# Altium schematic symbol library MCU_Microchip_ATmega.SchLib: 440 symbols (part 6 of 7)
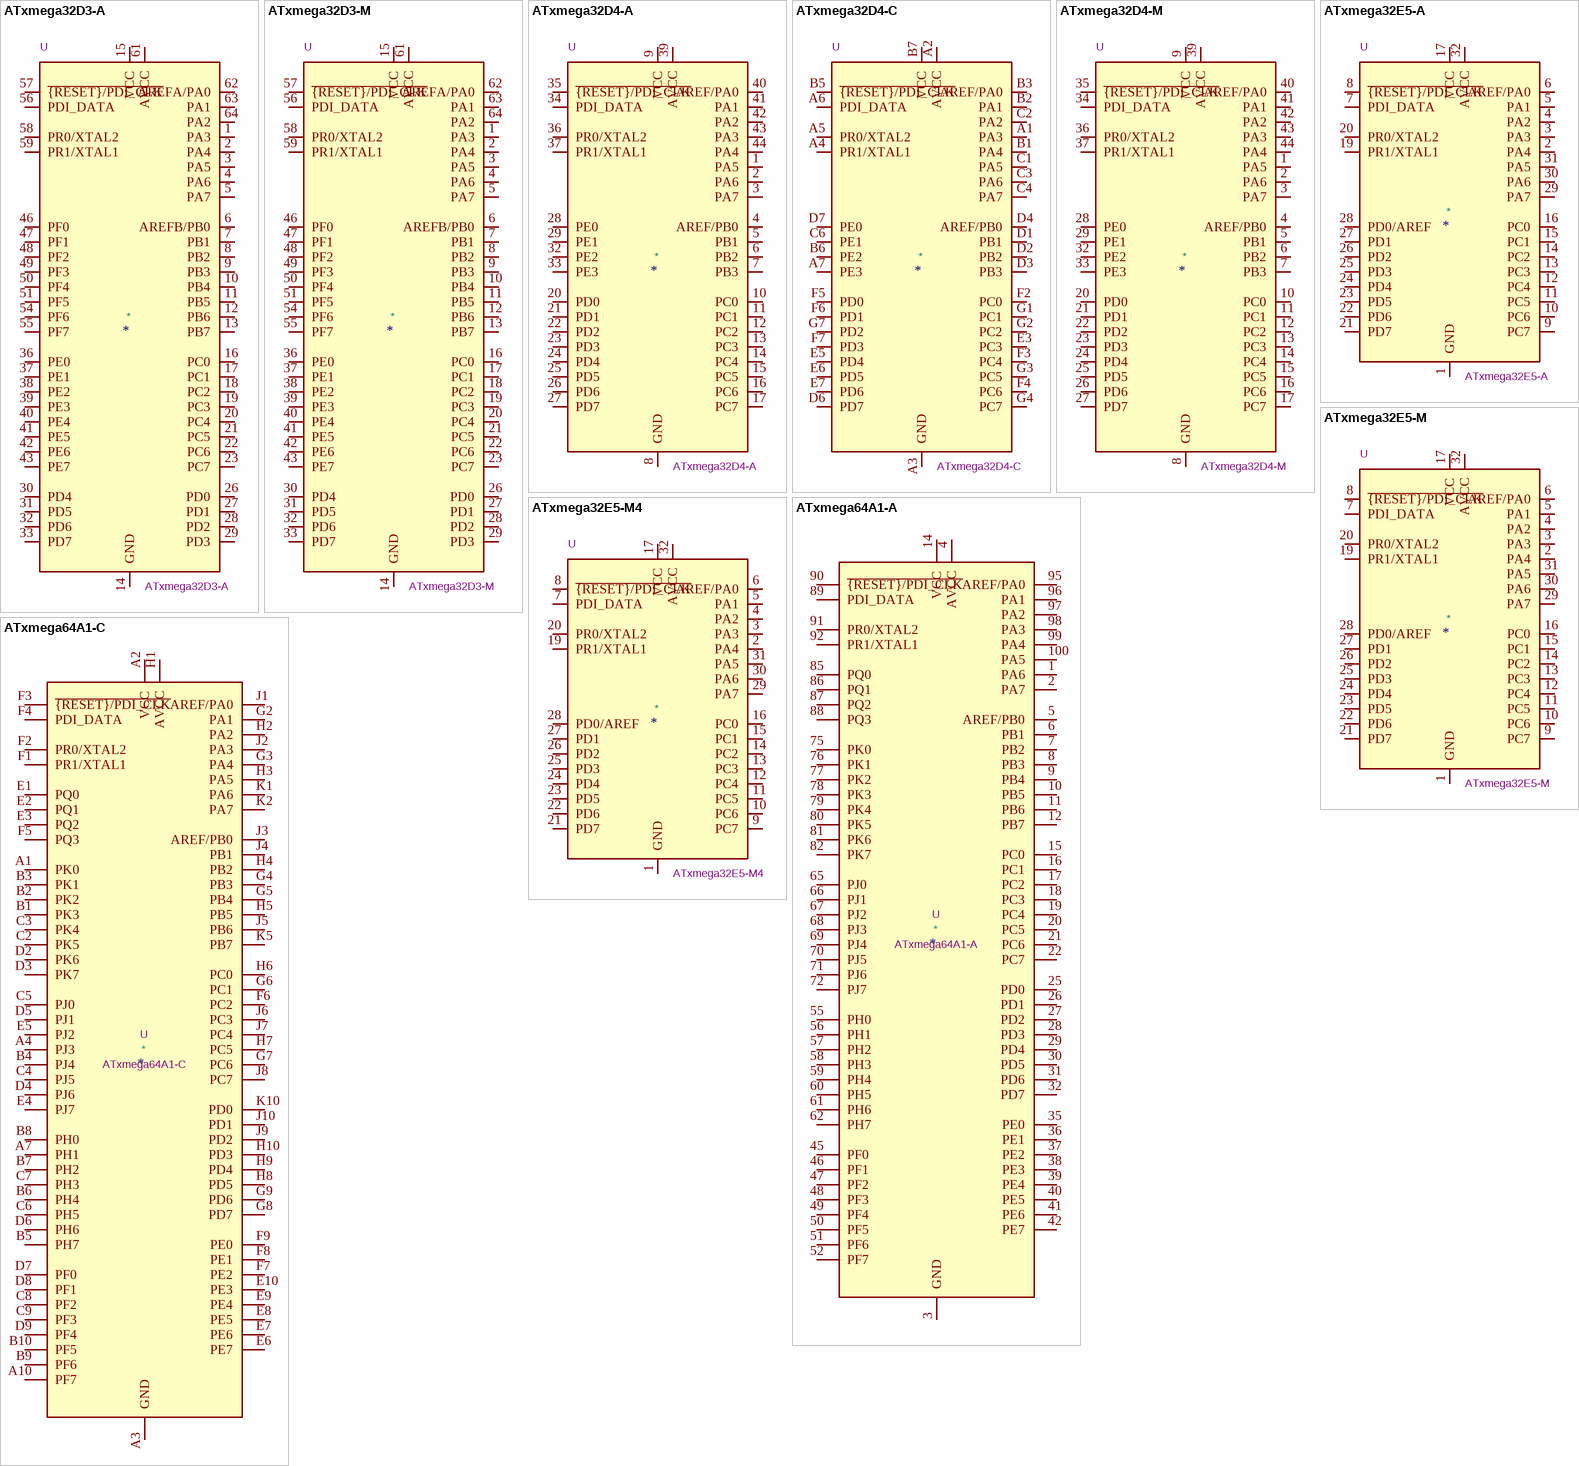
[diagram p45: symbols ATxmega32D3-A to ATxmega64A1-C]

## ATxmega64A1-A
designator *  value ATxmega64A1-A  Reference: U
ki_keywords: AVR 8/16bit Microcontroller XMegaAVR; ki_description: 32MHz, 64kB Flash, 4kB Boot, 4kB SRAM, 2kB EEPROM, JTAG, TQFP-100; ki_fp_filters: TQFP*14x14mm*P0.5mm*; Footprint: Package_QFP:TQFP-100_14x14mm_P0.5mm; Datasheet: http://ww1.microchip.com/downloads/en/DeviceDoc/Atmel-8067-8-and-16-bit-AVR-Microcontrollers-ATxmega64A1-ATxmega128A1_Datasheet.pdf
pins: 1 PA6, 2 PA7, 3 GND, 4 AVCC, 5 AREF/PB0, 6 PB1, 7 PB2, 8 PB3, 9 PB4, 10 PB5, 11 PB6, 12 PB7, 13 GND hidden, 14 VCC, 15 PC0, 16 PC1, 17 PC2, 18 PC3, 19 PC4, 20 PC5, 21 PC6, 22 PC7, 23 GND hidden, 24 VCC hidden, 25 PD0, 26 PD1, 27 PD2, 28 PD3, 29 PD4, 30 PD5, 31 PD6, 32 PD7, 33 GND hidden, 34 VCC hidden, 35 PE0, 36 PE1, 37 PE2, 38 PE3, 39 PE4, 40 PE5, 41 PE6, 42 PE7, 43 GND hidden, 44 VCC hidden, 45 PF0, 46 PF1, 47 PF2, 48 PF3, 49 PF4, 50 PF5, 51 PF6, 52 PF7, 53 GND hidden, 54 VCC hidden, 55 PH0, 56 PH1, 57 PH2, 58 PH3, 59 PH4, 60 PH5, 61 PH6, 62 PH7, 63 GND hidden, 64 VCC hidden, 65 PJ0, 66 PJ1, 67 PJ2, 68 PJ3, 69 PJ4, 70 PJ5, 71 PJ6, 72 PJ7, 73 GND hidden, 74 VCC hidden, 75 PK0, 76 PK1, 77 PK2, 78 PK3, 79 PK4, 80 PK5, 81 PK6, 82 PK7, 83 VCC hidden, 84 GND hidden, 85 PQ0, 86 PQ1, 87 PQ2, 88 PQ3, 89 PDI_DATA, 90 ~{{RESET}/PDI_CLK}, 91 PR0/XTAL2, 92 PR1/XTAL1, 93 GND hidden, 94 AVCC hidden, 95 AREF/PA0, 96 PA1, 97 PA2, 98 PA3, 99 PA4, 100 PA5

## ATxmega64A1-C
designator *  value ATxmega64A1-C  Reference: U
ki_keywords: AVR 8/16bit Microcontroller XMegaAVR; ki_description: 32MHz, 64kB Flash, 4kB Boot, 4kB SRAM, 2kB EEPROM, JTAG, TFBGA-100; ki_fp_filters: TFBGA*9.0x9.0mm*Layout10x10*P0.8mm*; Footprint: Package_BGA:TFBGA-100_9.0x9.0mm_Layout10x10_P0.8mm; Datasheet: http://ww1.microchip.com/downloads/en/DeviceDoc/Atmel-8067-8-and-16-bit-AVR-Microcontrollers-ATxmega64A1-ATxmega128A1_Datasheet.pdf
pins: A1 PK0, A2 VCC, A3 GND, A4 PJ3, A5 VCC hidden, A6 GND hidden, A7 PH1, A8 GND hidden, A9 VCC hidden, A10 PF7, B1 PK3, B2 PK2, B3 PK1, B4 PJ4, B5 PH7, B6 PH4, B7 PH2, B8 PH0, B9 PF6, B10 PF5, C1 VCC hidden, C2 PK5, C3 PK4, C4 PJ5, C5 PJ0, C6 PH5, C7 PH3, C8 PF2, C9 PF3, C10 VCC hidden, D1 GND hidden, D2 PK6, D3 PK7, D4 PJ6, D5 PJ1, D6 PH6, D7 PF0, D8 PF1, D9 PF4, D10 GND hidden, E1 PQ0, E2 PQ1, E3 PQ2, E4 PJ7, E5 PJ2, E6 PE7, E7 PE6, E8 PE5, E9 PE4, E10 PE3, F1 PR1/XTAL1, F2 PR0/XTAL2, F3 ~{{RESET}/PDI_CLK}, F4 PDI_DATA, F5 PQ3, F6 PC2, F7 PE2, F8 PE1, F9 PE0, F10 VCC hidden, G1 GND hidden, G2 PA1, G3 PA4, G4 PB3, G5 PB4, G6 PC1, G7 PC6, G8 PD7, G9 PD6, G10 GND hidden, H1 AVCC, H2 PA2, H3 PA5, H4 PB2, H5 PB5, H6 PC0, H7 PC5, H8 PD5, H9 PD4, H10 PD3, J1 AREF/PA0, J2 PA3, J3 AREF/PB0, J4 PB1, J5 PB6, J6 PC3, J7 PC4, J8 PC7, J9 PD2, J10 PD1, K1 PA6, K2 PA7, K3 GND hidden, K4 AVCC hidden, K5 PB7, K6 VCC hidden, K7 GND hidden, K8 VCC hidden, K9 GND hidden, K10 PD0

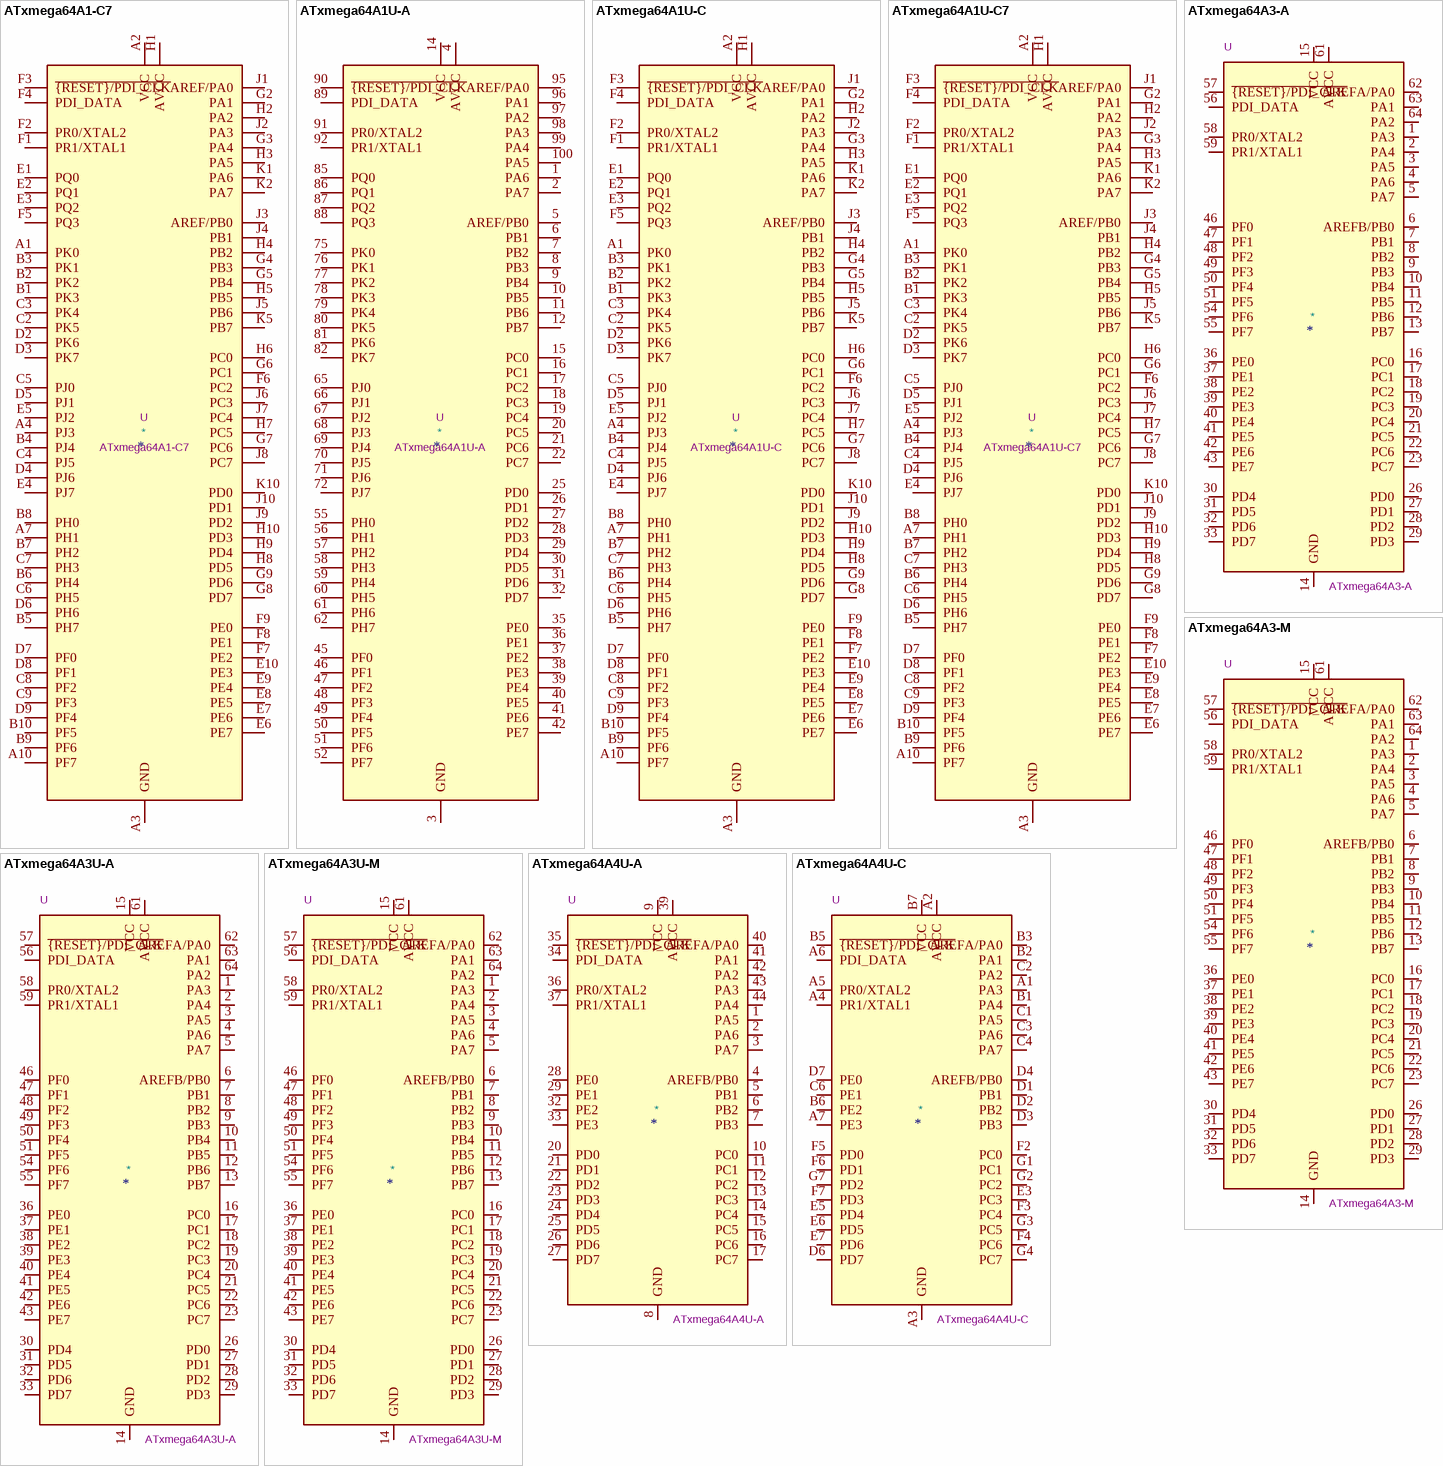
[diagram p33: symbols ATxmega64A1-C7 to ATxmega64A4U-C]

## ATxmega64A1-C7
designator *  value ATxmega64A1-C7  Reference: U
ki_keywords: AVR 8/16bit Microcontroller XMegaAVR; ki_description: 32MHz, 64kB Flash, 4kB Boot, 4kB SRAM, 2kB EEPROM, JTAG, VFBGA-100; ki_fp_filters: VFBGA*7.0x7.0mm*Layout10x10*P0.65mm*; Footprint: Package_BGA:VFBGA-100_7.0x7.0mm_Layout10x10_P0.65mm; Datasheet: http://ww1.microchip.com/downloads/en/DeviceDoc/Atmel-8067-8-and-16-bit-AVR-Microcontrollers-ATxmega64A1-ATxmega128A1_Datasheet.pdf
pins: A1 PK0, A2 VCC, A3 GND, A4 PJ3, A5 VCC hidden, A6 GND hidden, A7 PH1, A8 GND hidden, A9 VCC hidden, A10 PF7, B1 PK3, B2 PK2, B3 PK1, B4 PJ4, B5 PH7, B6 PH4, B7 PH2, B8 PH0, B9 PF6, B10 PF5, C1 VCC hidden, C2 PK5, C3 PK4, C4 PJ5, C5 PJ0, C6 PH5, C7 PH3, C8 PF2, C9 PF3, C10 VCC hidden, D1 GND hidden, D2 PK6, D3 PK7, D4 PJ6, D5 PJ1, D6 PH6, D7 PF0, D8 PF1, D9 PF4, D10 GND hidden, E1 PQ0, E2 PQ1, E3 PQ2, E4 PJ7, E5 PJ2, E6 PE7, E7 PE6, E8 PE5, E9 PE4, E10 PE3, F1 PR1/XTAL1, F2 PR0/XTAL2, F3 ~{{RESET}/PDI_CLK}, F4 PDI_DATA, F5 PQ3, F6 PC2, F7 PE2, F8 PE1, F9 PE0, F10 VCC hidden, G1 GND hidden, G2 PA1, G3 PA4, G4 PB3, G5 PB4, G6 PC1, G7 PC6, G8 PD7, G9 PD6, G10 GND hidden, H1 AVCC, H2 PA2, H3 PA5, H4 PB2, H5 PB5, H6 PC0, H7 PC5, H8 PD5, H9 PD4, H10 PD3, J1 AREF/PA0, J2 PA3, J3 AREF/PB0, J4 PB1, J5 PB6, J6 PC3, J7 PC4, J8 PC7, J9 PD2, J10 PD1, K1 PA6, K2 PA7, K3 GND hidden, K4 AVCC hidden, K5 PB7, K6 VCC hidden, K7 GND hidden, K8 VCC hidden, K9 GND hidden, K10 PD0

## ATxmega64A1U-A
designator *  value ATxmega64A1U-A  Reference: U
ki_keywords: AVR 8/16bit Microcontroller XMegaAVR; ki_description: 32MHz, 64kB Flash, 4kB Boot, 4kB SRAM, 2kB EEPROM, JTAG, USB, TQFP-100; ki_fp_filters: TQFP*14x14mm*P0.5mm*; Footprint: Package_QFP:TQFP-100_14x14mm_P0.5mm; Datasheet: http://ww1.microchip.com/downloads/en/DeviceDoc/Atmel-8385-8-and-16-bit-AVR-Microcontroller-ATxmega64A1U-ATxmega128A1U_datasheet.pdf
pins: 1 PA6, 2 PA7, 3 GND, 4 AVCC, 5 AREF/PB0, 6 PB1, 7 PB2, 8 PB3, 9 PB4, 10 PB5, 11 PB6, 12 PB7, 13 GND hidden, 14 VCC, 15 PC0, 16 PC1, 17 PC2, 18 PC3, 19 PC4, 20 PC5, 21 PC6, 22 PC7, 23 GND hidden, 24 VCC hidden, 25 PD0, 26 PD1, 27 PD2, 28 PD3, 29 PD4, 30 PD5, 31 PD6, 32 PD7, 33 GND hidden, 34 VCC hidden, 35 PE0, 36 PE1, 37 PE2, 38 PE3, 39 PE4, 40 PE5, 41 PE6, 42 PE7, 43 GND hidden, 44 VCC hidden, 45 PF0, 46 PF1, 47 PF2, 48 PF3, 49 PF4, 50 PF5, 51 PF6, 52 PF7, 53 GND hidden, 54 VCC hidden, 55 PH0, 56 PH1, 57 PH2, 58 PH3, 59 PH4, 60 PH5, 61 PH6, 62 PH7, 63 GND hidden, 64 VCC hidden, 65 PJ0, 66 PJ1, 67 PJ2, 68 PJ3, 69 PJ4, 70 PJ5, 71 PJ6, 72 PJ7, 73 GND hidden, 74 VCC hidden, 75 PK0, 76 PK1, 77 PK2, 78 PK3, 79 PK4, 80 PK5, 81 PK6, 82 PK7, 83 VCC hidden, 84 GND hidden, 85 PQ0, 86 PQ1, 87 PQ2, 88 PQ3, 89 PDI_DATA, 90 ~{{RESET}/PDI_CLK}, 91 PR0/XTAL2, 92 PR1/XTAL1, 93 GND hidden, 94 AVCC hidden, 95 AREF/PA0, 96 PA1, 97 PA2, 98 PA3, 99 PA4, 100 PA5

## ATxmega64A1U-C
designator *  value ATxmega64A1U-C  Reference: U
ki_keywords: AVR 8/16bit Microcontroller XMegaAVR; ki_description: 32MHz, 64kB Flash, 4kB Boot, 4kB SRAM, 2kB EEPROM, JTAG, USB, TFBGA-100; ki_fp_filters: TFBGA*9.0x9.0mm*Layout10x10*P0.8mm*; Footprint: Package_BGA:TFBGA-100_9.0x9.0mm_Layout10x10_P0.8mm; Datasheet: http://ww1.microchip.com/downloads/en/DeviceDoc/Atmel-8385-8-and-16-bit-AVR-Microcontroller-ATxmega64A1U-ATxmega128A1U_datasheet.pdf
pins: A1 PK0, A2 VCC, A3 GND, A4 PJ3, A5 VCC hidden, A6 GND hidden, A7 PH1, A8 GND hidden, A9 VCC hidden, A10 PF7, B1 PK3, B2 PK2, B3 PK1, B4 PJ4, B5 PH7, B6 PH4, B7 PH2, B8 PH0, B9 PF6, B10 PF5, C1 VCC hidden, C2 PK5, C3 PK4, C4 PJ5, C5 PJ0, C6 PH5, C7 PH3, C8 PF2, C9 PF3, C10 VCC hidden, D1 GND hidden, D2 PK6, D3 PK7, D4 PJ6, D5 PJ1, D6 PH6, D7 PF0, D8 PF1, D9 PF4, D10 GND hidden, E1 PQ0, E2 PQ1, E3 PQ2, E4 PJ7, E5 PJ2, E6 PE7, E7 PE6, E8 PE5, E9 PE4, E10 PE3, F1 PR1/XTAL1, F2 PR0/XTAL2, F3 ~{{RESET}/PDI_CLK}, F4 PDI_DATA, F5 PQ3, F6 PC2, F7 PE2, F8 PE1, F9 PE0, F10 VCC hidden, G1 GND hidden, G2 PA1, G3 PA4, G4 PB3, G5 PB4, G6 PC1, G7 PC6, G8 PD7, G9 PD6, G10 GND hidden, H1 AVCC, H2 PA2, H3 PA5, H4 PB2, H5 PB5, H6 PC0, H7 PC5, H8 PD5, H9 PD4, H10 PD3, J1 AREF/PA0, J2 PA3, J3 AREF/PB0, J4 PB1, J5 PB6, J6 PC3, J7 PC4, J8 PC7, J9 PD2, J10 PD1, K1 PA6, K2 PA7, K3 GND hidden, K4 AVCC hidden, K5 PB7, K6 VCC hidden, K7 GND hidden, K8 VCC hidden, K9 GND hidden, K10 PD0

## ATxmega64A1U-C7
designator *  value ATxmega64A1U-C7  Reference: U
ki_keywords: AVR 8/16bit Microcontroller XMegaAVR; ki_description: 32MHz, 64kB Flash, 4kB Boot, 4kB SRAM, 2kB EEPROM, JTAG, USB, VFBGA-100; ki_fp_filters: VFBGA*7.0x7.0mm*Layout10x10*P0.65mm*; Footprint: Package_BGA:VFBGA-100_7.0x7.0mm_Layout10x10_P0.65mm; Datasheet: http://ww1.microchip.com/downloads/en/DeviceDoc/Atmel-8385-8-and-16-bit-AVR-Microcontroller-ATxmega64A1U-ATxmega128A1U_datasheet.pdf
pins: A1 PK0, A2 VCC, A3 GND, A4 PJ3, A5 VCC hidden, A6 GND hidden, A7 PH1, A8 GND hidden, A9 VCC hidden, A10 PF7, B1 PK3, B2 PK2, B3 PK1, B4 PJ4, B5 PH7, B6 PH4, B7 PH2, B8 PH0, B9 PF6, B10 PF5, C1 VCC hidden, C2 PK5, C3 PK4, C4 PJ5, C5 PJ0, C6 PH5, C7 PH3, C8 PF2, C9 PF3, C10 VCC hidden, D1 GND hidden, D2 PK6, D3 PK7, D4 PJ6, D5 PJ1, D6 PH6, D7 PF0, D8 PF1, D9 PF4, D10 GND hidden, E1 PQ0, E2 PQ1, E3 PQ2, E4 PJ7, E5 PJ2, E6 PE7, E7 PE6, E8 PE5, E9 PE4, E10 PE3, F1 PR1/XTAL1, F2 PR0/XTAL2, F3 ~{{RESET}/PDI_CLK}, F4 PDI_DATA, F5 PQ3, F6 PC2, F7 PE2, F8 PE1, F9 PE0, F10 VCC hidden, G1 GND hidden, G2 PA1, G3 PA4, G4 PB3, G5 PB4, G6 PC1, G7 PC6, G8 PD7, G9 PD6, G10 GND hidden, H1 AVCC, H2 PA2, H3 PA5, H4 PB2, H5 PB5, H6 PC0, H7 PC5, H8 PD5, H9 PD4, H10 PD3, J1 AREF/PA0, J2 PA3, J3 AREF/PB0, J4 PB1, J5 PB6, J6 PC3, J7 PC4, J8 PC7, J9 PD2, J10 PD1, K1 PA6, K2 PA7, K3 GND hidden, K4 AVCC hidden, K5 PB7, K6 VCC hidden, K7 GND hidden, K8 VCC hidden, K9 GND hidden, K10 PD0

## ATxmega64A3-A
designator *  value ATxmega64A3-A  Reference: U
ki_keywords: AVR 8/16bit Microcontroller XMegaAVR; ki_description: 32MHz, 64kB Flash, 4kB Boot, 4kB SRAM, 2kB EEPROM, JTAG, TQFP-64; ki_fp_filters: TQFP*14x14mm*P0.8mm*; Footprint: Package_QFP:TQFP-64_14x14mm_P0.8mm; Datasheet: http://ww1.microchip.com/downloads/en/DeviceDoc/Atmel-8068-8-and16-bit-AVR-XMEGA-A3-Microcontrollers_Datasheet.pdf
pins: 1 PA3, 2 PA4, 3 PA5, 4 PA6, 5 PA7, 6 AREFB/PB0, 7 PB1, 8 PB2, 9 PB3, 10 PB4, 11 PB5, 12 PB6, 13 PB7, 14 GND, 15 VCC, 16 PC0, 17 PC1, 18 PC2, 19 PC3, 20 PC4, 21 PC5, 22 PC6, 23 PC7, 24 GND hidden, 25 VCC hidden, 26 PD0, 27 PD1, 28 PD2, 29 PD3, 30 PD4, 31 PD5, 32 PD6, 33 PD7, 34 GND hidden, 35 VCC hidden, 36 PE0, 37 PE1, 38 PE2, 39 PE3, 40 PE4, 41 PE5, 42 PE6, 43 PE7, 44 GND hidden, 45 VCC hidden, 46 PF0, 47 PF1, 48 PF2, 49 PF3, 50 PF4, 51 PF5, 52 GND hidden, 53 VCC hidden, 54 PF6, 55 PF7, 56 PDI_DATA, 57 ~{{RESET}/PDI_CLK}, 58 PR0/XTAL2, 59 PR1/XTAL1, 60 GND hidden, 61 AVCC, 62 AREFA/PA0, 63 PA1, 64 PA2

## ATxmega64A3-M
designator *  value ATxmega64A3-M  Reference: U
ki_keywords: AVR 8/16bit Microcontroller XMegaAVR; ki_description: 32MHz, 64kB Flash, 4kB Boot, 4kB SRAM, 2kB EEPROM, JTAG, QFN-64; ki_fp_filters: QFN*1EP*9x9mm*P0.5mm*; Footprint: Package_DFN_QFN:QFN-64-1EP_9x9mm_P0.5mm_EP7.65x7.65mm; Datasheet: http://ww1.microchip.com/downloads/en/DeviceDoc/Atmel-8068-8-and16-bit-AVR-XMEGA-A3-Microcontrollers_Datasheet.pdf
pins: 1 PA3, 2 PA4, 3 PA5, 4 PA6, 5 PA7, 6 AREFB/PB0, 7 PB1, 8 PB2, 9 PB3, 10 PB4, 11 PB5, 12 PB6, 13 PB7, 14 GND, 15 VCC, 16 PC0, 17 PC1, 18 PC2, 19 PC3, 20 PC4, 21 PC5, 22 PC6, 23 PC7, 24 GND hidden, 25 VCC hidden, 26 PD0, 27 PD1, 28 PD2, 29 PD3, 30 PD4, 31 PD5, 32 PD6, 33 PD7, 34 GND hidden, 35 VCC hidden, 36 PE0, 37 PE1, 38 PE2, 39 PE3, 40 PE4, 41 PE5, 42 PE6, 43 PE7, 44 GND hidden, 45 VCC hidden, 46 PF0, 47 PF1, 48 PF2, 49 PF3, 50 PF4, 51 PF5, 52 GND hidden, 53 VCC hidden, 54 PF6, 55 PF7, 56 PDI_DATA, 57 ~{{RESET}/PDI_CLK}, 58 PR0/XTAL2, 59 PR1/XTAL1, 60 GND hidden, 61 AVCC, 62 AREFA/PA0, 63 PA1, 64 PA2, 65 GND hidden

## ATxmega64A3U-A
designator *  value ATxmega64A3U-A  Reference: U
ki_keywords: AVR 8/16bit Microcontroller XMegaAVR; ki_description: 32MHz, 64kB Flash, 4kB Boot, 4kB SRAM, 2kB EEPROM, JTAG, USB, TQFP-64; ki_fp_filters: TQFP*14x14mm*P0.8mm*; Footprint: Package_QFP:TQFP-64_14x14mm_P0.8mm; Datasheet: http://ww1.microchip.com/downloads/en/DeviceDoc/Atmel-8386-8-and-16-bit-AVR-Microcontroller-ATxmega64A3U-128A3U-192A3U-256A3U_datasheet.pdf
pins: 1 PA3, 2 PA4, 3 PA5, 4 PA6, 5 PA7, 6 AREFB/PB0, 7 PB1, 8 PB2, 9 PB3, 10 PB4, 11 PB5, 12 PB6, 13 PB7, 14 GND, 15 VCC, 16 PC0, 17 PC1, 18 PC2, 19 PC3, 20 PC4, 21 PC5, 22 PC6, 23 PC7, 24 GND hidden, 25 VCC hidden, 26 PD0, 27 PD1, 28 PD2, 29 PD3, 30 PD4, 31 PD5, 32 PD6, 33 PD7, 34 GND hidden, 35 VCC hidden, 36 PE0, 37 PE1, 38 PE2, 39 PE3, 40 PE4, 41 PE5, 42 PE6, 43 PE7, 44 GND hidden, 45 VCC hidden, 46 PF0, 47 PF1, 48 PF2, 49 PF3, 50 PF4, 51 PF5, 52 GND hidden, 53 VCC hidden, 54 PF6, 55 PF7, 56 PDI_DATA, 57 ~{{RESET}/PDI_CLK}, 58 PR0/XTAL2, 59 PR1/XTAL1, 60 GND hidden, 61 AVCC, 62 AREFA/PA0, 63 PA1, 64 PA2

## ATxmega64A3U-M
designator *  value ATxmega64A3U-M  Reference: U
ki_keywords: AVR 8/16bit Microcontroller XMegaAVR; ki_description: 32MHz, 64kB Flash, 4kB Boot, 4kB SRAM, 2kB EEPROM, JTAG, USB, QFN-64; ki_fp_filters: QFN*1EP*9x9mm*P0.5mm*; Footprint: Package_DFN_QFN:QFN-64-1EP_9x9mm_P0.5mm_EP7.65x7.65mm; Datasheet: http://ww1.microchip.com/downloads/en/DeviceDoc/Atmel-8386-8-and-16-bit-AVR-Microcontroller-ATxmega64A3U-128A3U-192A3U-256A3U_datasheet.pdf
pins: 1 PA3, 2 PA4, 3 PA5, 4 PA6, 5 PA7, 6 AREFB/PB0, 7 PB1, 8 PB2, 9 PB3, 10 PB4, 11 PB5, 12 PB6, 13 PB7, 14 GND, 15 VCC, 16 PC0, 17 PC1, 18 PC2, 19 PC3, 20 PC4, 21 PC5, 22 PC6, 23 PC7, 24 GND hidden, 25 VCC hidden, 26 PD0, 27 PD1, 28 PD2, 29 PD3, 30 PD4, 31 PD5, 32 PD6, 33 PD7, 34 GND hidden, 35 VCC hidden, 36 PE0, 37 PE1, 38 PE2, 39 PE3, 40 PE4, 41 PE5, 42 PE6, 43 PE7, 44 GND hidden, 45 VCC hidden, 46 PF0, 47 PF1, 48 PF2, 49 PF3, 50 PF4, 51 PF5, 52 GND hidden, 53 VCC hidden, 54 PF6, 55 PF7, 56 PDI_DATA, 57 ~{{RESET}/PDI_CLK}, 58 PR0/XTAL2, 59 PR1/XTAL1, 60 GND hidden, 61 AVCC, 62 AREFA/PA0, 63 PA1, 64 PA2, 65 GND hidden

## ATxmega64A4U-A
designator *  value ATxmega64A4U-A  Reference: U
ki_keywords: AVR 8/16bit Microcontroller XMegaAVR; ki_description: 32MHz, 64kB Flash, 4kB Boot, 4kB SRAM, 2kB EEPROM, JTAG, USB, TQFP-44; ki_fp_filters: TQFP*10x10mm*P0.8mm*; Footprint: Package_QFP:TQFP-44_10x10mm_P0.8mm; Datasheet: http://ww1.microchip.com/downloads/en/DeviceDoc/Atmel-8387-8-and16-bit-AVR-Microcontroller-XMEGA-A4U_Datasheet.pdf
pins: 1 PA5, 2 PA6, 3 PA7, 4 AREFB/PB0, 5 PB1, 6 PB2, 7 PB3, 8 GND, 9 VCC, 10 PC0, 11 PC1, 12 PC2, 13 PC3, 14 PC4, 15 PC5, 16 PC6, 17 PC7, 18 GND hidden, 19 VCC hidden, 20 PD0, 21 PD1, 22 PD2, 23 PD3, 24 PD4, 25 PD5, 26 PD6, 27 PD7, 28 PE0, 29 PE1, 30 GND hidden, 31 VCC hidden, 32 PE2, 33 PE3, 34 PDI_DATA, 35 ~{{RESET}/PDI_CLK}, 36 PR0/XTAL2, 37 PR1/XTAL1, 38 GND hidden, 39 AVCC, 40 AREFA/PA0, 41 PA1, 42 PA2, 43 PA3, 44 PA4

## ATxmega64A4U-C
designator *  value ATxmega64A4U-C  Reference: U
ki_keywords: AVR 8/16bit Microcontroller XMegaAVR; ki_description: 32MHz, 64kB Flash, 4kB Boot, 4kB SRAM, 2kB EEPROM, JTAG, USB, VFBGA-49; ki_fp_filters: VFBGA*5.0x5.0mm*Layout7x7*P0.65mm*; Footprint: Package_BGA:VFBGA-49_5.0x5.0mm_Layout7x7_P0.65mm; Datasheet: http://ww1.microchip.com/downloads/en/DeviceDoc/Atmel-8387-8-and16-bit-AVR-Microcontroller-XMEGA-A4U_Datasheet.pdf
pins: A1 PA3, A2 AVCC, A3 GND, A4 PR1/XTAL1, A5 PR0/XTAL2, A6 PDI_DATA, A7 PE3, B1 PA4, B2 PA1, B3 AREFA/PA0, B4 GND hidden, B5 ~{{RESET}/PDI_CLK}, B6 PE2, B7 VCC, C1 PA5, C2 PA2, C3 PA6, C4 PA7, C5 GND hidden, C6 PE1, C7 GND hidden, D1 PB1, D2 PB2, D3 PB3, D4 AREFB/PB0, D5 GND hidden, D6 PD7, D7 PE0, E1 GND hidden, E2 GND hidden, E3 PC3, E4 GND hidden, E5 PD4, E6 PD5, E7 PD6, F1 VCC hidden, F2 PC0, F3 PC4, F4 PC6, F5 PD0, F6 PD1, F7 PD3, G1 PC1, G2 PC2, G3 PC5, G4 PC7, G5 GND hidden, G6 VCC hidden, G7 PD2

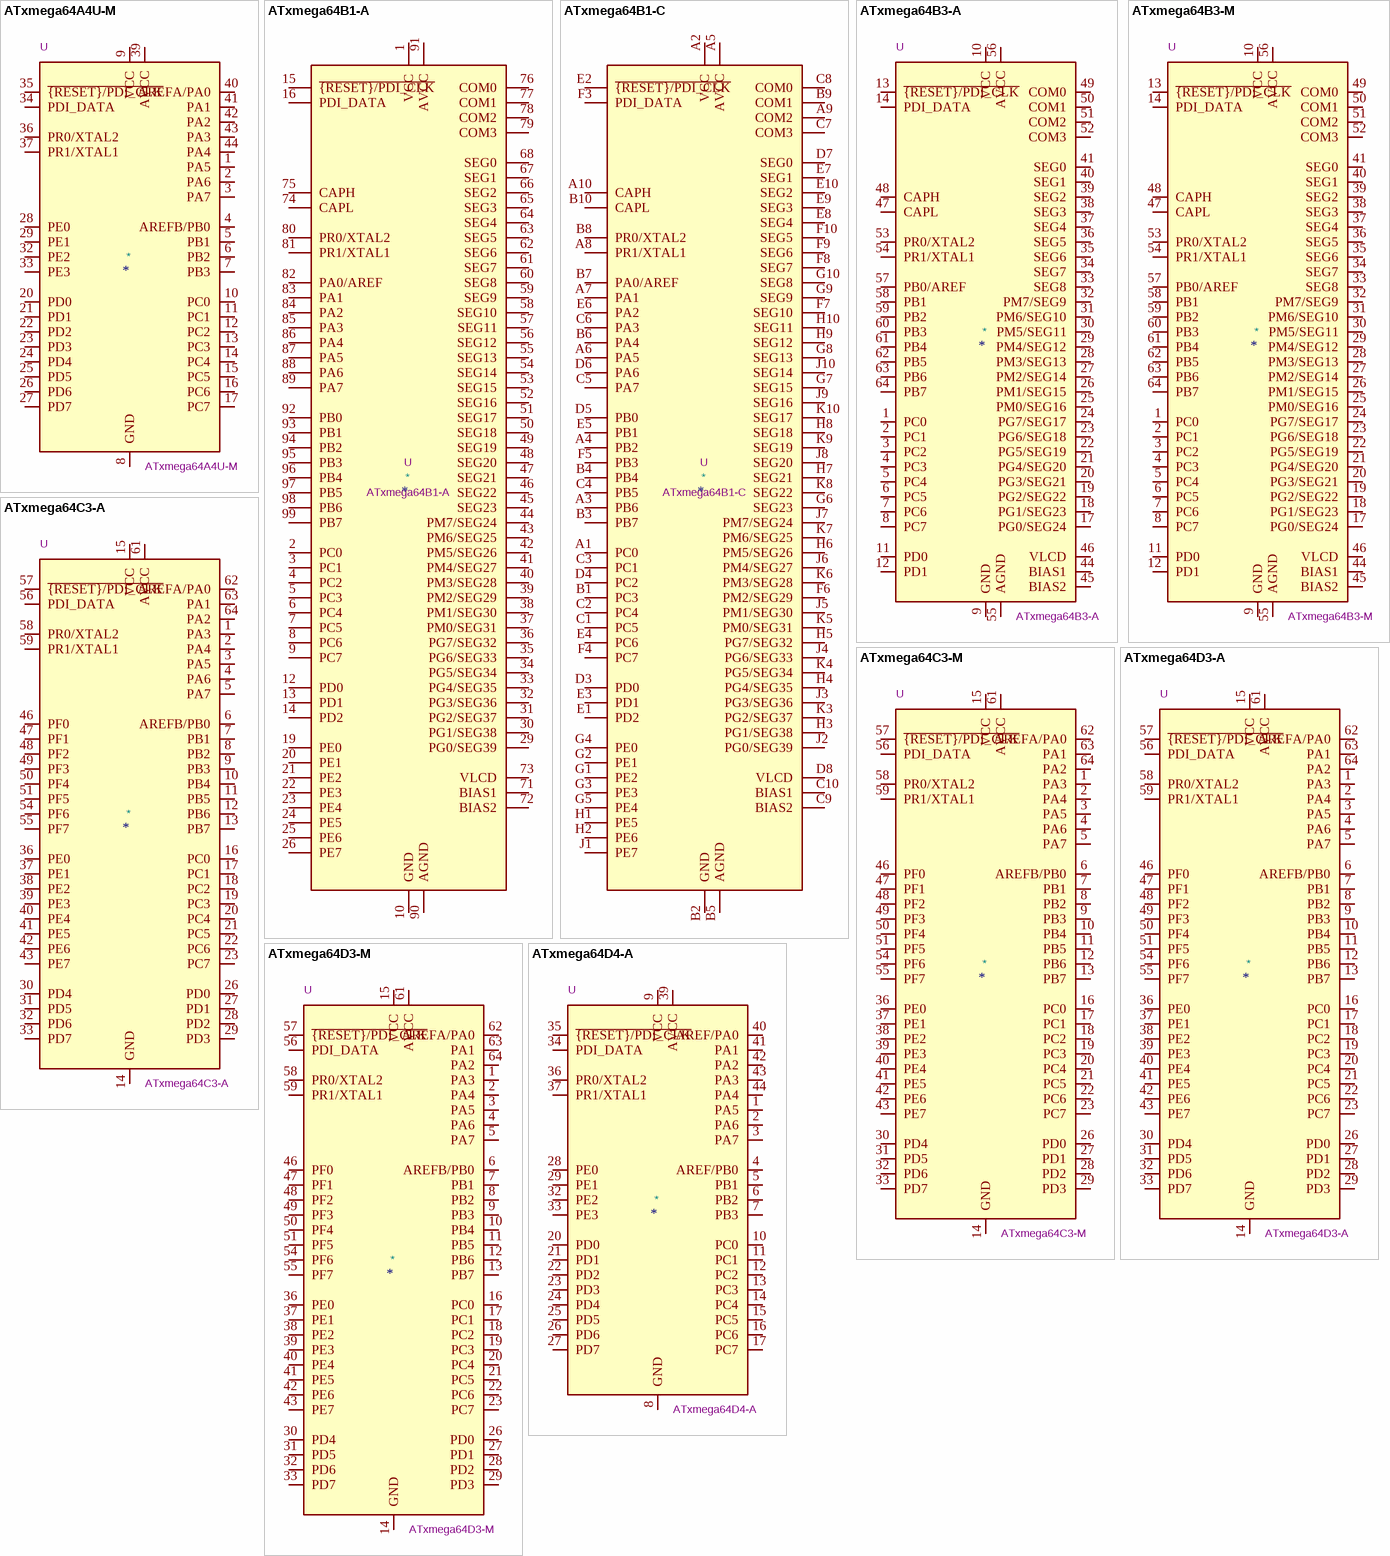
[diagram p34: symbols ATxmega64A4U-M to ATxmega64D4-A]

## ATxmega64A4U-M
designator *  value ATxmega64A4U-M  Reference: U
ki_keywords: AVR 8/16bit Microcontroller XMegaAVR; ki_description: 32MHz, 64kB Flash, 4kB Boot, 4kB SRAM, 2kB EEPROM, JTAG, USB, QFN-44; ki_fp_filters: QFN*1EP*7x7mm*P0.5mm*; Footprint: Package_DFN_QFN:QFN-44-1EP_7x7mm_P0.5mm_EP5.2x5.2mm; Datasheet: http://ww1.microchip.com/downloads/en/DeviceDoc/Atmel-8387-8-and16-bit-AVR-Microcontroller-XMEGA-A4U_Datasheet.pdf
pins: 1 PA5, 2 PA6, 3 PA7, 4 AREFB/PB0, 5 PB1, 6 PB2, 7 PB3, 8 GND, 9 VCC, 10 PC0, 11 PC1, 12 PC2, 13 PC3, 14 PC4, 15 PC5, 16 PC6, 17 PC7, 18 GND hidden, 19 VCC hidden, 20 PD0, 21 PD1, 22 PD2, 23 PD3, 24 PD4, 25 PD5, 26 PD6, 27 PD7, 28 PE0, 29 PE1, 30 GND hidden, 31 VCC hidden, 32 PE2, 33 PE3, 34 PDI_DATA, 35 ~{{RESET}/PDI_CLK}, 36 PR0/XTAL2, 37 PR1/XTAL1, 38 GND hidden, 39 AVCC, 40 AREFA/PA0, 41 PA1, 42 PA2, 43 PA3, 44 PA4, 45 GND hidden

## ATxmega64B1-A
designator *  value ATxmega64B1-A  Reference: U
ki_keywords: AVR 8/16bit Microcontroller XMegaAVR; ki_description: 32MHz, 64kB Flash, 4kB Boot, 4kB SRAM, 2kB EEPROM, JTAG, USB, LCD, TQFP-100; ki_fp_filters: TQFP*14x14mm*P0.5mm*; Footprint: Package_QFP:TQFP-100_14x14mm_P0.5mm; Datasheet: http://ww1.microchip.com/downloads/en/DeviceDoc/Atmel-8330-8-and-16-bit-AVR-Microcontroller-XMEGA-B-ATxmega64B1-ATxmega128B1_Datasheet.pdf
pins: 1 VCC, 2 PC0, 3 PC1, 4 PC2, 5 PC3, 6 PC4, 7 PC5, 8 PC6, 9 PC7, 10 GND, 11 VCC hidden, 12 PD0, 13 PD1, 14 PD2, 15 ~{{RESET}/PDI_CLK}, 16 PDI_DATA, 17 GND hidden, 18 VCC hidden, 19 PE0, 20 PE1, 21 PE2, 22 PE3, 23 PE4, 24 PE5, 25 PE6, 26 PE7, 27 GND hidden, 28 VCC hidden, 29 PG0/SEG39, 30 PG1/SEG38, 31 PG2/SEG37, 32 PG3/SEG36, 33 PG4/SEG35, 34 PG5/SEG34, 35 PG6/SEG33, 36 PG7/SEG32, 37 PM0/SEG31, 38 PM1/SEG30, 39 PM2/SEG29, 40 PM3/SEG28, 41 PM4/SEG27, 42 PM5/SEG26, 43 PM6/SEG25, 44 PM7/SEG24, 45 SEG23, 46 SEG22, 47 SEG21, 48 SEG20, 49 SEG19, 50 SEG18, 51 SEG17, 52 SEG16, 53 SEG15, 54 SEG14, 55 SEG13, 56 SEG12, 57 SEG11, 58 SEG10, 59 SEG9, 60 SEG8, 61 SEG7, 62 SEG6, 63 SEG5, 64 SEG4, 65 SEG3, 66 SEG2, 67 SEG1, 68 SEG0, 69 GND hidden, 70 VCC hidden, 71 BIAS1, 72 BIAS2, 73 VLCD, 74 CAPL, 75 CAPH, 76 COM0, 77 COM1, 78 COM2, 79 COM3, 80 PR0/XTAL2, 81 PR1/XTAL1, 82 PA0/AREF, 83 PA1, 84 PA2, 85 PA3, 86 PA4, 87 PA5, 88 PA6, 89 PA7, 90 AGND, 91 AVCC, 92 PB0, 93 PB1, 94 PB2, 95 PB3, 96 PB4, 97 PB5, 98 PB6, 99 PB7, 100 GND hidden